# Altium footprint library ICs And Semiconductors SMD.PcbLib: 943 footprints (part 41 of 60)
Each footprint in its own frame and in the unit in brackets; x right, y up, seen from the top. Pads: shape width x height; smd on the part's side, far side on the other; paste and mask are expansions set on the pad; w line width, h text height; cw(c..) or ccw(c..) is an arc to the next point about the centre after c.
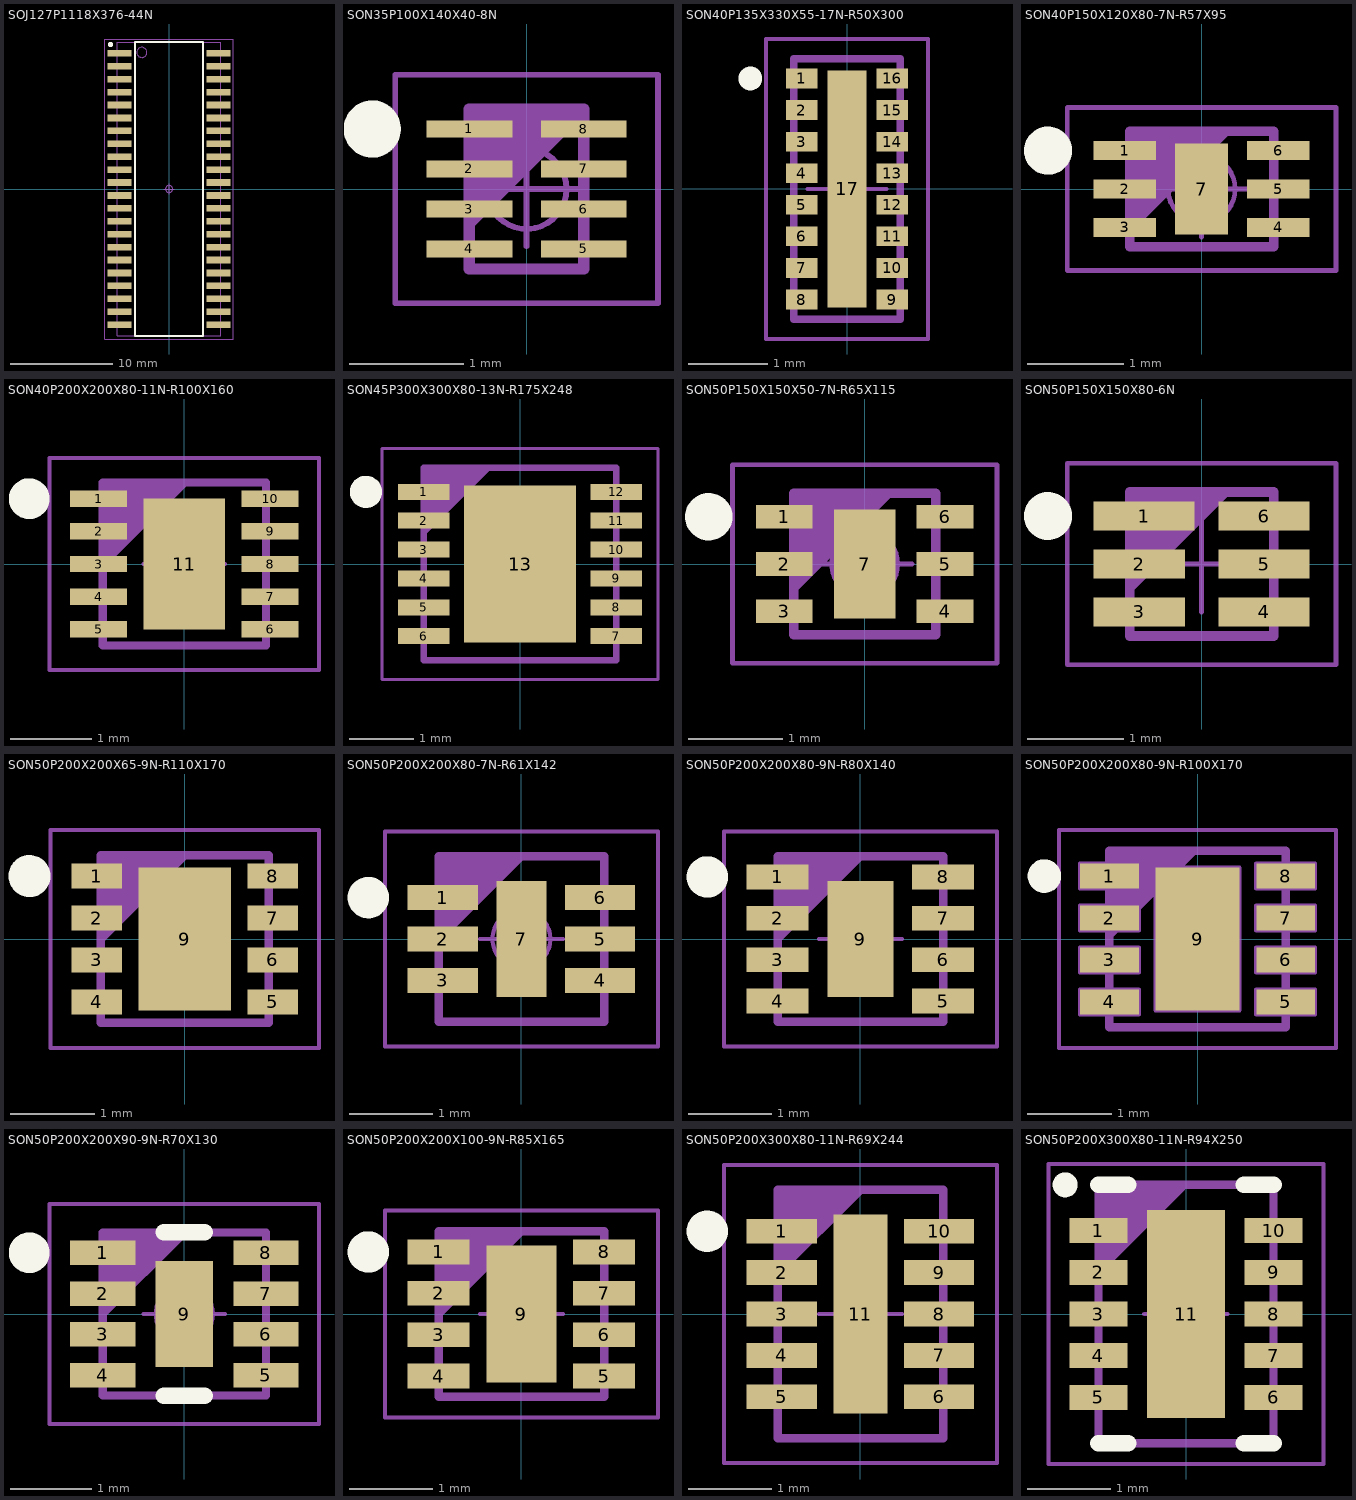
[diagram p40: the footprints below, top view; thin cyan lines are the x and y axes]

## SOJ127P1118X376-44N [mm] "SO J-Lead, 1.27mm Pitch; 44 Pin, 10.16mm W X 28.86mm L X 3.76mm H Body, IPC Medium Density"
height 1.2
pads (44):
  rect 2.35x0.65 smd: 1(-4.85,13.335) 2(-4.85,12.065) 3(-4.85,10.795) 4(-4.85,9.525) 5(-4.85,8.255) 6(-4.85,6.985) 7(-4.85,5.715) 8(-4.85,4.445) 9(-4.85,3.175) 10(-4.85,1.905) 11(-4.85,0.635) 12(-4.85,-0.635) 13(-4.85,-1.905) 14(-4.85,-3.175) 15(-4.85,-4.445) 16(-4.85,-5.715) 17(-4.85,-6.985) 18(-4.85,-8.255) 19(-4.85,-9.525) 20(-4.85,-10.795) 21(-4.85,-12.065) 22(-4.85,-13.335) 23(4.85,-13.335) 24(4.85,-12.065) 25(4.85,-10.795) 26(4.85,-9.525) 27(4.85,-8.255) 28(4.85,-6.985) 29(4.85,-5.715) 30(4.85,-4.445) 31(4.85,-3.175) 32(4.85,-1.905) 33(4.85,-0.635) 34(4.85,0.635) 35(4.85,1.905) 36(4.85,3.175) 37(4.85,4.445) 38(4.85,5.715) 39(4.85,6.985) 40(4.85,8.255) 41(4.85,9.525) 42(4.85,10.795) 43(4.85,12.065) 44(4.85,13.335)
Top Overlay:
  circle w0.25: c-5.75,14.2 r0.125
  lines w0.2: -3.35,-14.45 -3.35,14.45 3.35,14.45 3.35,-14.45 -3.35,-14.45
Mechanical 14:
  circle w0.1: c-2.675,13.43 r0.5
  lines w0.1: -5.08,-14.43 -5.08,14.43 5.08,14.43 5.08,-14.43 -5.08,-14.43
Mechanical 15:
  circle w0.05: c0,0 r0.35
  lines w0.05: -0.5,0 0.5,0 ; 0,-0.5 0,0.5 ; -6.3,-14.75 -6.3,14.75 6.3,14.75 6.3,-14.75 -6.3,-14.75
3D body "SOJ127P1118X376-44N.stp": height 3.68, standoff 0, extent -5.587,-14.49 5.588,14.49

## SON35P100X140X40-8N [mm] "SON, 0.35mm pitch, 8 pin, 1.4mm X 1mm X 0.4mm H body,  IPC Medium Density"
height 0.4
pads (8):
  rect 0.75x0.15 smd: 1(-0.5,0.525) 2(-0.5,0.175) 3(-0.5,-0.175) 4(-0.5,-0.525) 5(0.5,-0.525) 6(0.5,-0.175) 7(0.5,0.175) 8(0.5,0.525)
Top Overlay:
  circle w0.25: c-1.35,0.525 r0.125
Mechanical 14:
  lines w0.1: -0.5,-0.3 0.5,0.7 ; -0.5,-0.2 0.4,0.7 ; -0.5,-0.1 0.3,0.7 ; -0.5,0 0.2,0.7 ; -0.5,0.1 0.1,0.7 ; -0.5,0.2 0,0.7 ; -0.5,0.3 -0.1,0.7 ; -0.5,0.4 -0.2,0.7 ; -0.5,0.5 -0.3,0.7 ; -0.5,0.6 -0.4,0.7 ; 0.5,0.7 0.5,-0.7 -0.5,-0.7 -0.5,0.7 0.5,0.7
Mechanical 15:
  circle w0.05: c0,0 r0.35
  lines w0.05: -0.5,0 0.5,0 ; 0,-0.5 0,0.5 ; -1.15,-1 1.15,-1 1.15,1 -1.15,1 -1.15,-1
3D body "SON35P100X140X40-8N.stp": height 0.4, standoff 0, extent -0.524,-0.724 0.526,0.726

## SON40P135X330X55-17N-R50X300 [mm] "SON, 0.50mm Pitch, 16 Pin, 1.35mm W  X 3.3mm L X 0.55mm Height, (w/Thermal Tab 0.5 X 3 mm), IPC Medium Density"
height 0.55
pads (17):
  rect 0.4x0.25 smd: 1(-0.575,1.4) 2(-0.575,1) 3(-0.575,0.6) 4(-0.575,0.2) 5(-0.575,-0.2) 6(-0.575,-0.6) 7(-0.575,-1) 8(-0.575,-1.4) 9(0.575,-1.4) 10(0.575,-1) 11(0.575,-0.6) 12(0.575,-0.2) 13(0.575,0.2) 14(0.575,0.6) 15(0.575,1) 16(0.575,1.4)
  rect 0.5x3 smd: 17(0,0)
Top Overlay:
  circle w0.2: c-1.225,1.4 r0.05
Mechanical 14:
  lines w0.1: -0.675,-1.65 0.675,-1.65 0.675,1.65 -0.675,1.65 -0.675,-1.65
Mechanical 15:
  lines w0.05: -0.5,0 0.5,0 ; 0,-0.5 0,0.5 ; -1.025,-1.9 1.025,-1.9 1.025,1.9 -1.025,1.9 -1.025,-1.9
3D body: height 0.55, standoff 0, extent -0.675,-1.65 0.675,1.65

## SON40P150X120X80-7N-R57X95 [mm] "SON, 0.40mm Pitch, 6 Pins, 1.50mm W  X 1.20mm L X 0.80mm Height, (w/Thermal Tab 0.57 X 0.95 mm), IPC Medium Density"
height 0.8
pads (7):
  rect 0.65x0.2 smd: 1(-0.8,0.4) 2(-0.8,0) 3(-0.8,-0.4) 4(0.8,-0.4) 5(0.8,0) 6(0.8,0.4)
  rect 0.55x0.95 smd: 7(0,0)
Top Overlay:
  circle w0.25: c-1.6,0.4 r0.125
Mechanical 14:
  lines w0.1: -0.75,-0.4 0.25,0.6 ; -0.75,-0.3 0.15,0.6 ; -0.75,-0.2 0.05,0.6 ; -0.75,-0.1 -0.05,0.6 ; -0.75,0 -0.15,0.6 ; -0.75,0.1 -0.25,0.6 ; -0.75,0.2 -0.35,0.6 ; -0.75,0.3 -0.45,0.6 ; -0.75,0.4 -0.55,0.6 ; -0.75,0.5 -0.65,0.6 ; -0.75,-0.6 0.75,-0.6 0.75,0.6 -0.75,0.6 -0.75,-0.6
Mechanical 15:
  circle w0.05: c0,0 r0.35
  lines w0.05: -0.5,0 0.5,0 ; 0,-0.5 0,0.5 ; -1.4,-0.85 1.4,-0.85 1.4,0.85 -1.4,0.85 -1.4,-0.85
3D body "SON40P150X120X80-7N-R57X95.stp": height 0.8, standoff 0, extent -0.75,-0.6 0.75,0.6

## SON40P200X200X80-11N-R100X160 [mm] "SON, 0.40mm Pitch; 10 Pin, 2.00mm W X 2.00mm L X 0.80mm H Body, (w/thermal tab 1.00 X 1.60 mm), IPC Medium Density"
height 0.8
pads (11):
  rect 0.7x0.2 smd: 1(-1.05,0.8) 2(-1.05,0.4) 3(-1.05,0) 4(-1.05,-0.4) 5(-1.05,-0.8) 6(1.05,-0.8) 7(1.05,-0.4) 8(1.05,0) 9(1.05,0.4) 10(1.05,0.8)
  rect 1x1.6 smd paste-0.225: 11(0,0)
Top Overlay:
  circle w0.25: c-1.9,0.8 r0.125
Mechanical 14:
  lines w0.1: -1,0 0,1 ; -1,0.1 -0.1,1 ; -1,0.2 -0.2,1 ; -1,0.3 -0.3,1 ; -1,0.4 -0.4,1 ; -1,0.5 -0.5,1 ; -1,0.6 -0.6,1 ; -1,0.7 -0.7,1 ; -1,0.8 -0.8,1 ; -1,0.9 -0.9,1 ; -1,-1 -1,1 1,1 1,-1 -1,-1
Mechanical 15:
  circle w0.05: c0,0 r0.35
  lines w0.05: -0.5,0 0.5,0 ; 0,-0.5 0,0.5 ; -1.65,-1.3 1.65,-1.3 1.65,1.3 -1.65,1.3 -1.65,-1.3
3D body "SON40P200X200X80-11N-R100X160.stp": height 0.8, standoff 0, extent -1.05,-1.05 1.05,1.05

## SON45P300X300X80-13N-R175X248 [mm] "SON, 0.45mm Pitch; 12 Pin, 3.00mm W X 3.00mm L X 0.80mm H Body (w/Thermal tab 1.75 x 2.48mm), IPC Medium Density"
height 0.8
pads (13):
  rect 0.8x0.25 smd: 1(-1.5,1.125) 2(-1.5,0.675) 3(-1.5,0.225) 4(-1.5,-0.225) 5(-1.5,-0.675) 6(-1.5,-1.125) 7(1.5,-1.125) 8(1.5,-0.675) 9(1.5,-0.225) 10(1.5,0.225) 11(1.5,0.675) 12(1.5,1.125)
  rect 1.75x2.45 smd paste-0.37: 13(0,0)
Top Overlay:
  circle w0.25: c-2.4,1.125 r0.125
Top Solder:
  circle w0.05: c0,0 r0.35
  lines w0.05: -0.5,0 0.5,0 ; 0,-0.5 0,0.5
Mechanical 14:
  lines w0.1: -1.5,0.5 -0.5,1.5 ; -1.5,0.6 -0.6,1.5 ; -1.5,0.7 -0.7,1.5 ; -1.5,0.8 -0.8,1.5 ; -1.5,0.9 -0.9,1.5 ; -1.5,1 -1,1.5 ; -1.5,1.1 -1.1,1.5 ; -1.5,1.2 -1.2,1.5 ; -1.5,1.3 -1.3,1.5 ; -1.5,1.4 -1.4,1.5 ; -1.5,-1.5 -1.5,1.5 1.5,1.5 1.5,-1.5 -1.5,-1.5
Mechanical 15:
  lines w0.05: -2.15,-1.8 2.15,-1.8 2.15,1.8 -2.15,1.8 -2.15,-1.8
3D body "SON45P300X300X80-13N-R175X248.stp": height 0.8, standoff 0, extent -1.5,-1.5 1.5,1.5

## SON50P150X150X50-7N-R65X115 [mm] "SON (DFN), 0.50mm Pitch; 6 Pin, 1.50mm W X 1.50mm L X 0.50mm H body (w/thermal tab 0.65 X 1.15mm),  IPC Medium Density"
height 0.5
pads (7):
  rect 0.6x0.25 smd: 1(-0.85,0.5) 2(-0.85,0) 3(-0.85,-0.5) 4(0.85,-0.5) 5(0.85,0) 6(0.85,0.5)
  rect 0.65x1.15 smd: 7(0,0)
Top Overlay:
  circle w0.25: c-1.65,0.5 r0.125
Mechanical 14:
  lines w0.1: -0.75,-0.25 0.25,0.75 ; -0.75,-0.15 0.15,0.75 ; -0.75,-0.05 0.05,0.75 ; -0.75,0.05 -0.05,0.75 ; -0.75,0.15 -0.15,0.75 ; -0.75,0.25 -0.25,0.75 ; -0.75,0.35 -0.35,0.75 ; -0.75,0.45 -0.45,0.75 ; -0.75,0.55 -0.55,0.75 ; -0.75,0.65 -0.65,0.75 ; -0.75,-0.75 0.75,-0.75 0.75,0.75 -0.75,0.75 -0.75,-0.75
Mechanical 15:
  circle w0.05: c0,0 r0.35
  lines w0.05: -0.5,0 0.5,0 ; 0,-0.5 0,0.5 ; -1.4,-1.05 -1.4,1.05 1.4,1.05 1.4,-1.05 -1.4,-1.05
3D body "SON50P150X150X50-7N-R65X115.stp": height 0.5, standoff 0, extent -0.75,-0.75 0.75,0.75

## SON50P150X150X80-6N [mm] "SON, 0.50mm pitch, 6 pin, 1.5mm X 1.5mm X 0.8mm H body,  IPC Medium Density"
height 0.8
pads (6):
  rect 1.05x0.3 smd: 1(-0.6,0.5)
  rect 0.95x0.3 smd: 2(-0.65,0) 3(-0.65,-0.5) 4(0.65,-0.5) 5(0.65,0) 6(0.65,0.5)
Top Overlay:
  circle w0.25: c-1.6,0.5 r0.125
Mechanical 14:
  lines w0.1: -0.75,-0.25 0.25,0.75 ; -0.75,-0.15 0.15,0.75 ; -0.75,-0.05 0.05,0.75 ; -0.75,0.05 -0.05,0.75 ; -0.75,0.15 -0.15,0.75 ; -0.75,0.25 -0.25,0.75 ; -0.75,0.35 -0.35,0.75 ; -0.75,0.45 -0.45,0.75 ; -0.75,0.55 -0.55,0.75 ; -0.75,0.65 -0.65,0.75 ; -0.75,-0.75 0.75,-0.75 0.75,0.75 -0.75,0.75 -0.75,-0.75
Mechanical 15:
  lines w0.05: -0.5,0 0.5,0 ; 0,-0.5 0,0.5 ; -1.4,-1.05 -1.4,1.05 1.4,1.05 1.4,-1.05 -1.4,-1.05
3D body "SON50P150X150X80-6N.stp": height 0.8, standoff 0, extent -0.774,-0.774 0.776,0.776

## SON50P200X200X65-9N-R110X170 [mm] "SON, 0.50mm Pitch; 8 Pin, 2.00mm W X 2.00mm L X 0.65mm H body (w/thermal tab 1.1 X 1.7 mm), IPC Medium Density"
height 0.65
pads (9):
  rect 0.6x0.3 smd: 1(-1.05,0.75) 2(-1.05,0.25) 3(-1.05,-0.25) 4(-1.05,-0.75) 5(1.05,-0.75) 6(1.05,-0.25) 7(1.05,0.25) 8(1.05,0.75)
  rect 1.1x1.7 smd: 9(0,0)
Top Overlay:
  circle w0.25: c-1.85,0.75 r0.125
Mechanical 14:
  lines w0.1: -1,0 0,1 ; -1,0.1 -0.1,1 ; -1,0.2 -0.2,1 ; -1,0.3 -0.3,1 ; -1,0.4 -0.4,1 ; -1,0.5 -0.5,1 ; -1,0.6 -0.6,1 ; -1,0.7 -0.7,1 ; -1,0.8 -0.8,1 ; -1,0.9 -0.9,1 ; -1,-1 1,-1 1,1 -1,1 -1,-1
Mechanical 15:
  circle w0.05: c0,0 r0.35
  lines w0.05: -0.5,0 0.5,0 ; 0,-0.5 0,0.5 ; -1.6,-1.3 -1.6,1.3 1.6,1.3 1.6,-1.3 -1.6,-1.3
3D body "SON50P200X200X65-9N-R110X170.stp": height 0.65, standoff 0, extent -1,-1 1,1

## SON50P200X200X80-7N-R61X142 [mm] "SON, 0.50mm Pitch; 6 Pin,2.00mm W X 2.00mm L X 0.80mm H Body (w/thermal tab 0.61 X 1.42mm),  IPC Medium Density"
height 0.8
pads (7):
  rect 0.85x0.3 smd: 1(-0.95,0.5) 2(-0.95,0) 3(-0.95,-0.5) 4(0.95,-0.5) 5(0.95,0) 6(0.95,0.5)
  rect 0.6x1.4 smd: 7(0,0)
Top Overlay:
  circle w0.25: c-1.85,0.5 r0.125
Mechanical 14:
  lines w0.1: -1,0 0,1 ; -1,0.1 -0.1,1 ; -1,0.2 -0.2,1 ; -1,0.3 -0.3,1 ; -1,0.4 -0.4,1 ; -1,0.5 -0.5,1 ; -1,0.6 -0.6,1 ; -1,0.7 -0.7,1 ; -1,0.8 -0.8,1 ; -1,0.9 -0.9,1 ; -1,-1 -1,1 1,1 1,-1 -1,-1
Mechanical 15:
  circle w0.05: c0,0 r0.35
  lines w0.05: -0.5,0 0.5,0 ; 0,-0.5 0,0.5 ; -1.65,-1.3 1.65,-1.3 1.65,1.3 -1.65,1.3 -1.65,-1.3
3D body "SON50P200X200X80-7N-R61X142.stp": height 0.8, standoff 0, extent -1,-1 1,1

## SON50P200X200X80-9N-R80X140 [mm] "SON, 0.50mm Pitch; 8 Pin,2.00mm W X 2.00mm L X 0.80mm H Body, (w/thermal tab 0.8 X 1.4mm), IPC Medium Density"
height 1.1
pads (9):
  rect 0.75x0.3 smd: 1(-1,0.75) 2(-1,0.25) 3(-1,-0.25) 4(-1,-0.75) 5(1,-0.75) 6(1,-0.25) 7(1,0.25) 8(1,0.75)
  rect 0.8x1.4 smd: 9(0,0)
Top Overlay:
  circle w0.25: c-1.85,0.75 r0.125
Mechanical 14:
  lines w0.1: -1,0 0,1 ; -1,0.1 -0.1,1 ; -1,0.2 -0.2,1 ; -1,0.3 -0.3,1 ; -1,0.4 -0.4,1 ; -1,0.5 -0.5,1 ; -1,0.6 -0.6,1 ; -1,0.7 -0.7,1 ; -1,0.8 -0.8,1 ; -1,0.9 -0.9,1 ; -1,-1 1,-1 1,1 -1,1 -1,-1
Mechanical 15:
  circle w0.05: c0,0 r0.35
  lines w0.05: -0.5,0 0.5,0 ; 0,-0.5 0,0.5 ; -1.65,-1.3 -1.65,1.3 1.65,1.3 1.65,-1.3 -1.65,-1.3
3D body "SON50P200X200X80-9N-R80X140.stp": height 0.75, standoff -0.05, extent -1,-1 1,1

## SON50P200X200X80-9N-R100X170 [mm] "SON, 0.50mm Pitch; 8 Pin, 2.00mm W X 2.00mm L X 0.80mm H body (w/thermal tab 1.0 X 1.7 mm), IPC Medium Density"
height 0.8
pads (9):
  rect 0.7x0.3 smd: 1(-1.05,0.75) 2(-1.05,0.25) 3(-1.05,-0.25) 4(-1.05,-0.75) 5(1.05,-0.75) 6(1.05,-0.25) 7(1.05,0.25) 8(1.05,0.75)
  rect 1x1.7 smd: 9(0,0)
Top Overlay:
  circle w0.2: c-1.825,0.75 r0.1
Mechanical 8:
  lines w0.05: -0.5,0 0,0 ; 0,-0.5 0,0 ; 0,0.5 0,0 ; 0.5,0 0,0 ; -1.4,-0.9 -1.05,-0.75 -1.4,-0.6 ; -1.4,-0.9 -1.4,-0.6 ; -1.4,-0.9 -0.7,-0.9 -0.7,-0.6 -1.4,-0.6 ; -1.4,-0.4 -1.05,-0.25 -1.4,-0.1 ; -1.4,-0.4 -1.4,-0.1 ; -1.4,-0.4 -0.7,-0.4 -0.7,-0.1 -1.4,-0.1 ; -1.4,0.1 -1.05,0.25 -1.4,0.4 ; -1.4,0.1 -1.4,0.4 ; -1.4,0.1 -0.7,0.1 -0.7,0.4 -1.4,0.4 ; -1.4,0.6 -1.05,0.75 -1.4,0.9 ; -1.4,0.6 -1.4,0.9 ; -1.4,0.6 -0.7,0.6 -0.7,0.9 -1.4,0.9 ; 1.4,-0.9 1.05,-0.75 1.4,-0.6 ; 1.4,-0.9 1.4,-0.6 ; 1.4,-0.9 0.7,-0.9 0.7,-0.6 1.4,-0.6 ; 1.4,-0.4 1.05,-0.25 1.4,-0.1 ; 1.4,-0.4 1.4,-0.1 ; 1.4,-0.4 0.7,-0.4 0.7,-0.1 1.4,-0.1 ; 1.4,0.1 1.05,0.25 1.4,0.4 ; 1.4,0.1 1.4,0.4 ; 1.4,0.1 0.7,0.1 0.7,0.4 1.4,0.4 ; 1.4,0.6 1.05,0.75 1.4,0.9 ; 1.4,0.6 1.4,0.9 ; 1.4,0.6 0.7,0.6 0.7,0.9 1.4,0.9 ; -0.5,-0.85 -0.5,0.85 0.5,0.85 0.5,-0.85 -0.5,-0.85
Mechanical 14:
  lines w0.1: -1.05,0.05 -0.05,1.05 ; -1.05,0.15 -0.15,1.05 ; -1.05,0.25 -0.25,1.05 ; -1.05,0.35 -0.35,1.05 ; -1.05,0.45 -0.45,1.05 ; -1.05,0.55 -0.55,1.05 ; -1.05,0.65 -0.65,1.05 ; -1.05,0.75 -0.75,1.05 ; -1.05,0.85 -0.85,1.05 ; -1.05,0.95 -0.95,1.05 ; -1.05,-1.05 -1.05,1.05 1.05,1.05 1.05,-1.05 -1.05,-1.05
Mechanical 15:
  circle w0.05: c0,0 r0.35
  lines w0.05: -0.5,0 0.5,0 ; 0,-0.5 0,0.5 ; -1.65,-1.3 1.65,-1.3 1.65,1.3 -1.65,1.3 -1.65,-1.3
3D body "SON50P200X200X80-9N-R100X170.stp": height 0.8, standoff 0, extent -1.05,-1.05 1.05,1.05

## SON50P200X200X90-9N-R70X130 [mm] "SON, 0.50mm Pitch; 8 Pin, 2.00mm W X 2.00mm L X 0.90mm H body (w/thermal tab 0.7 X 1.3 mm), IPC Medium Density"
height 1.1
pads (9):
  rect 0.8x0.3 smd: 1(-1,0.75) 2(-1,0.25) 3(-1,-0.25) 4(-1,-0.75) 5(1,-0.75) 6(1,-0.25) 7(1,0.25) 8(1,0.75)
  rect 0.7x1.3 smd paste-0.165: 9(0,0)
Top Overlay:
  circle w0.25: c-1.9,0.75 r0.125
  lines w0.2: -0.25,-1 0.25,-1 ; -0.25,1 0.25,1
Mechanical 14:
  lines w0.1: -1,0 0,1 ; -1,0.1 -0.1,1 ; -1,0.2 -0.2,1 ; -1,0.3 -0.3,1 ; -1,0.4 -0.4,1 ; -1,0.5 -0.5,1 ; -1,0.6 -0.6,1 ; -1,0.7 -0.7,1 ; -1,0.8 -0.8,1 ; -1,0.9 -0.9,1 ; -1,-1 -1,1 1,1 1,-1 -1,-1
Mechanical 15:
  circle w0.05: c0,0 r0.35
  lines w0.05: -0.5,0 0.5,0 ; 0,-0.5 0,0.5 ; -1.65,-1.35 1.65,-1.35 1.65,1.35 -1.65,1.35 -1.65,-1.35
3D body "SON50P200X200X90-9N-R70X130.stp": height 0.9, standoff 0, extent -1,-1 1,1

## SON50P200X200X100-9N-R85X165 [mm] "SON, 0.50mm Pitch; 8 Pin, 2.00mm W X 2.00mm L X 1.00mm H body (w/thermal tab 0.85 X 1.65 mm), IPC Medium Density"
height 1
pads (9):
  rect 0.75x0.3 smd: 1(-1,0.75) 2(-1,0.25) 3(-1,-0.25) 4(-1,-0.75) 5(1,-0.75) 6(1,-0.25) 7(1,0.25) 8(1,0.75)
  rect 0.85x1.65 smd: 9(0,0)
Top Overlay:
  circle w0.25: c-1.85,0.75 r0.125
Mechanical 14:
  lines w0.1: -1,0 0,1 ; -1,0.1 -0.1,1 ; -1,0.2 -0.2,1 ; -1,0.3 -0.3,1 ; -1,0.4 -0.4,1 ; -1,0.5 -0.5,1 ; -1,0.6 -0.6,1 ; -1,0.7 -0.7,1 ; -1,0.8 -0.8,1 ; -1,0.9 -0.9,1 ; -1,-1 1,-1 1,1 -1,1 -1,-1
Mechanical 15:
  circle w0.05: c0,0 r0.35
  lines w0.05: -0.5,0 0.5,0 ; 0,-0.5 0,0.5 ; -1.65,-1.25 -1.65,1.25 1.65,1.25 1.65,-1.25 -1.65,-1.25
3D body "SON50P200X200X100-9N-R85X165.stp": height 1, standoff 0, extent -1,-1 1,1

## SON50P200X300X80-11N-R69X244 [mm] "SON, 0.50mm Pitch, 10-pin, 2.00mm W  X 3mm L X 0.80mm Height, (w/thermal tab 0.69 X 2.44 mm), IPC Medium Density"
height 1.1
pads (11):
  rect 0.85x0.3 smd: 1(-0.95,1) 2(-0.95,0.5) 3(-0.95,0) 4(-0.95,-0.5) 5(-0.95,-1) 6(0.95,-1) 7(0.95,-0.5) 8(0.95,0) 9(0.95,0.5) 10(0.95,1)
  rect 0.65x2.4 smd: 11(0,0)
Top Overlay:
  circle w0.25: c-1.85,1 r0.125
Mechanical 14:
  lines w0.1: -1,0.5 0,1.5 ; -1,0.6 -0.1,1.5 ; -1,0.7 -0.2,1.5 ; -1,0.8 -0.3,1.5 ; -1,0.9 -0.4,1.5 ; -1,1 -0.5,1.5 ; -1,1.1 -0.6,1.5 ; -1,1.2 -0.7,1.5 ; -1,1.3 -0.8,1.5 ; -1,1.4 -0.9,1.5 ; -1,-1.5 -1,1.5 1,1.5 1,-1.5 -1,-1.5
Mechanical 15:
  lines w0.05: -0.5,0 0.5,0 ; 0,-0.5 0,0.5 ; -1.65,-1.8 -1.65,1.8 1.65,1.8 1.65,-1.8 -1.65,-1.8
3D body "SON50P200X300X80-11N-R69X244.stp": height 0.8, standoff 0, extent -1.05,-1.55 1.05,1.55

## SON50P200X300X80-11N-R94X250 [mm] "SON, 10-Leads, Body 2x3mm, Pitch 0.5mm, Thermal Pad 0.94x2.5mm, IPC Medium Density"
height 0.8
pads (11):
  rect 0.7x0.3 smd: 1(-1.05,1) 2(-1.05,0.5) 3(-1.05,0) 4(-1.05,-0.5) 5(-1.05,-1) 6(1.05,-1) 7(1.05,-0.5) 8(1.05,0) 9(1.05,0.5) 10(1.05,1)
  rect 0.94x2.5 smd: 11(0,0)
Top Overlay:
  circle w0.2: c-1.45,1.55 r0.05
  lines w0.2: -1.05,-1.55 -0.695,-1.55 ; -1.05,1.55 -0.695,1.55 ; 0.695,-1.55 1.05,-1.55 ; 0.695,1.55 1.05,1.55
Top Paste:
  rectangle: -0.45,-1.25 0.45,1.25
Mechanical 14:
  lines w0.1: -1.05,0.525 -0.05,1.525 ; -1.05,0.625 -0.15,1.525 ; -1.05,0.725 -0.25,1.525 ; -1.05,0.825 -0.35,1.525 ; -1.05,0.925 -0.45,1.525 ; -1.05,1.025 -0.55,1.525 ; -1.05,1.125 -0.65,1.525 ; -1.05,1.225 -0.75,1.525 ; -1.05,1.325 -0.85,1.525 ; -1.05,1.425 -0.95,1.525 ; -1.05,-1.55 -1.05,1.55 1.05,1.55 1.05,-1.55 -1.05,-1.55
Mechanical 15:
  lines w0.05: -0.5,0 0.5,0 ; 0,-0.5 0,0.5 ; -1.65,-1.8 -1.65,1.8 1.65,1.8 1.65,-1.8 -1.65,-1.8
3D body "SON50P200X300X80-11N-R94X250.stp": height 0.8, standoff 0, extent -1.05,-1.55 1.05,1.55